# Altium footprint library 电容封装库.PcbLib: 100 footprints (part 7 of 7)
Each footprint in its own frame and in the unit in brackets; x right, y up, seen from the top. Pads: shape width x height; smd on the part's side, far side on the other; paste and mask are expansions set on the pad; w line width, h text height; cw(c..) or ccw(c..) is an arc to the next point about the centre after c.
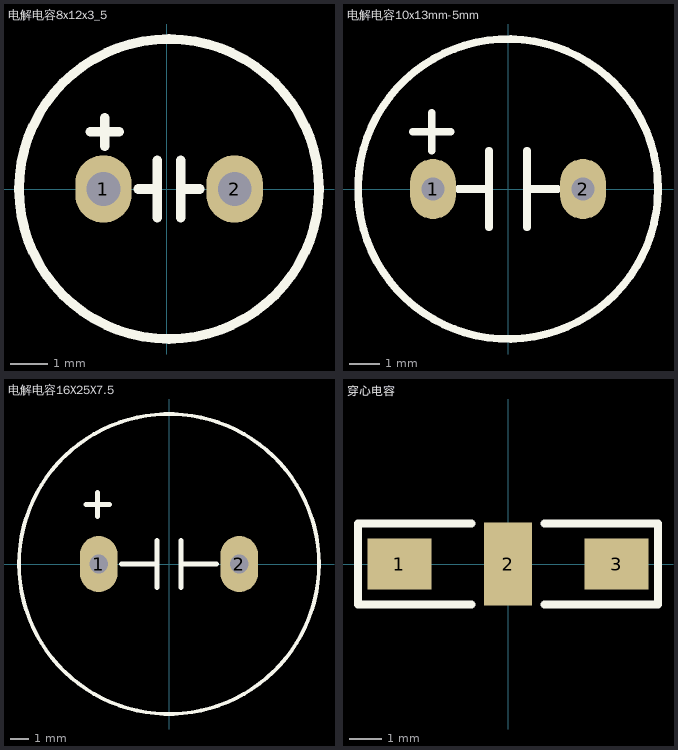
[diagram p6: the footprints below, top view; thin cyan lines are the x and y axes]

## 电解电容8x12x3_5 [mm] "电解电容8x12x3_5"
height 12
pads (2):
  oval 1.5x1.8 hole 0.9: 1(-1.687,0) 2(1.813,0)
Top Overlay:
  circle w0.254: c0.063,0 r4
  lines w0.254: -2.032,1.524 -1.27,1.524 ; -1.651,1.143 -1.651,1.905 ; -0.762,0 -0.254,0 ; -0.254,-0.762 -0.254,0.762 ; 0.381,-0.762 0.381,0.762 ; 0.381,0 0.889,0

## 电解电容10x13mm-5mm [mm] "10x13mm-5mm"
pads (2):
  oval 1.524x2 hole 0.762: 1(-2.5,0) 2(2.5,0)
Top Overlay:
  circle w0.254: c0,0 r5
  lines w0.254: -3.175,1.905 -1.905,1.905 ; -2.54,1.27 -2.54,2.54 ; -1.651,0 -0.635,0 ; -0.635,-1.27 -0.635,1.27 ; 0.635,-1.27 0.635,1.27 ; 0.635,0 1.651,0

## 电解电容16X25X7.5 [mm]
height 25
pads (2):
  oval 2x3 hole 1: 1(-3.75,0) 2(3.75,0)
Top Overlay:
  circle w0.2: c0,0 r8
  lines w0.254: -4.445,3.175 -3.175,3.175 ; -3.81,2.54 -3.81,3.81 ; -2.54,0 -0.635,0 ; -0.635,-1.27 -0.635,1.27 ; 0.635,-1.27 0.635,1.27 ; 0.635,0 2.54,0

## 穿心电容 [mm] "NFE61PT102E1H9L"
height 1.6
pads (3):
  rect 2x1.6 smd: 1(-3.4,0) 3(3.4,0)
  rect 1.5x2.6 smd: 2(0,0)
Top Overlay:
  lines w0.254: -1.143,-1.27 -4.699,-1.27 -4.699,1.27 -1.143,1.27 ; 1.143,-1.27 4.699,-1.27 4.699,1.27 1.143,1.27